# Altium footprint library AltiumDesignerLibraries.PcbLib: 313 footprints (part 2 of 20)
Each footprint in its own frame and in the unit in brackets; x right, y up, seen from the top. Pads: shape width x height; smd on the part's side, far side on the other; paste and mask are expansions set on the pad; w line width, h text height; cw(c..) or ccw(c..) is an arc to the next point about the centre after c.
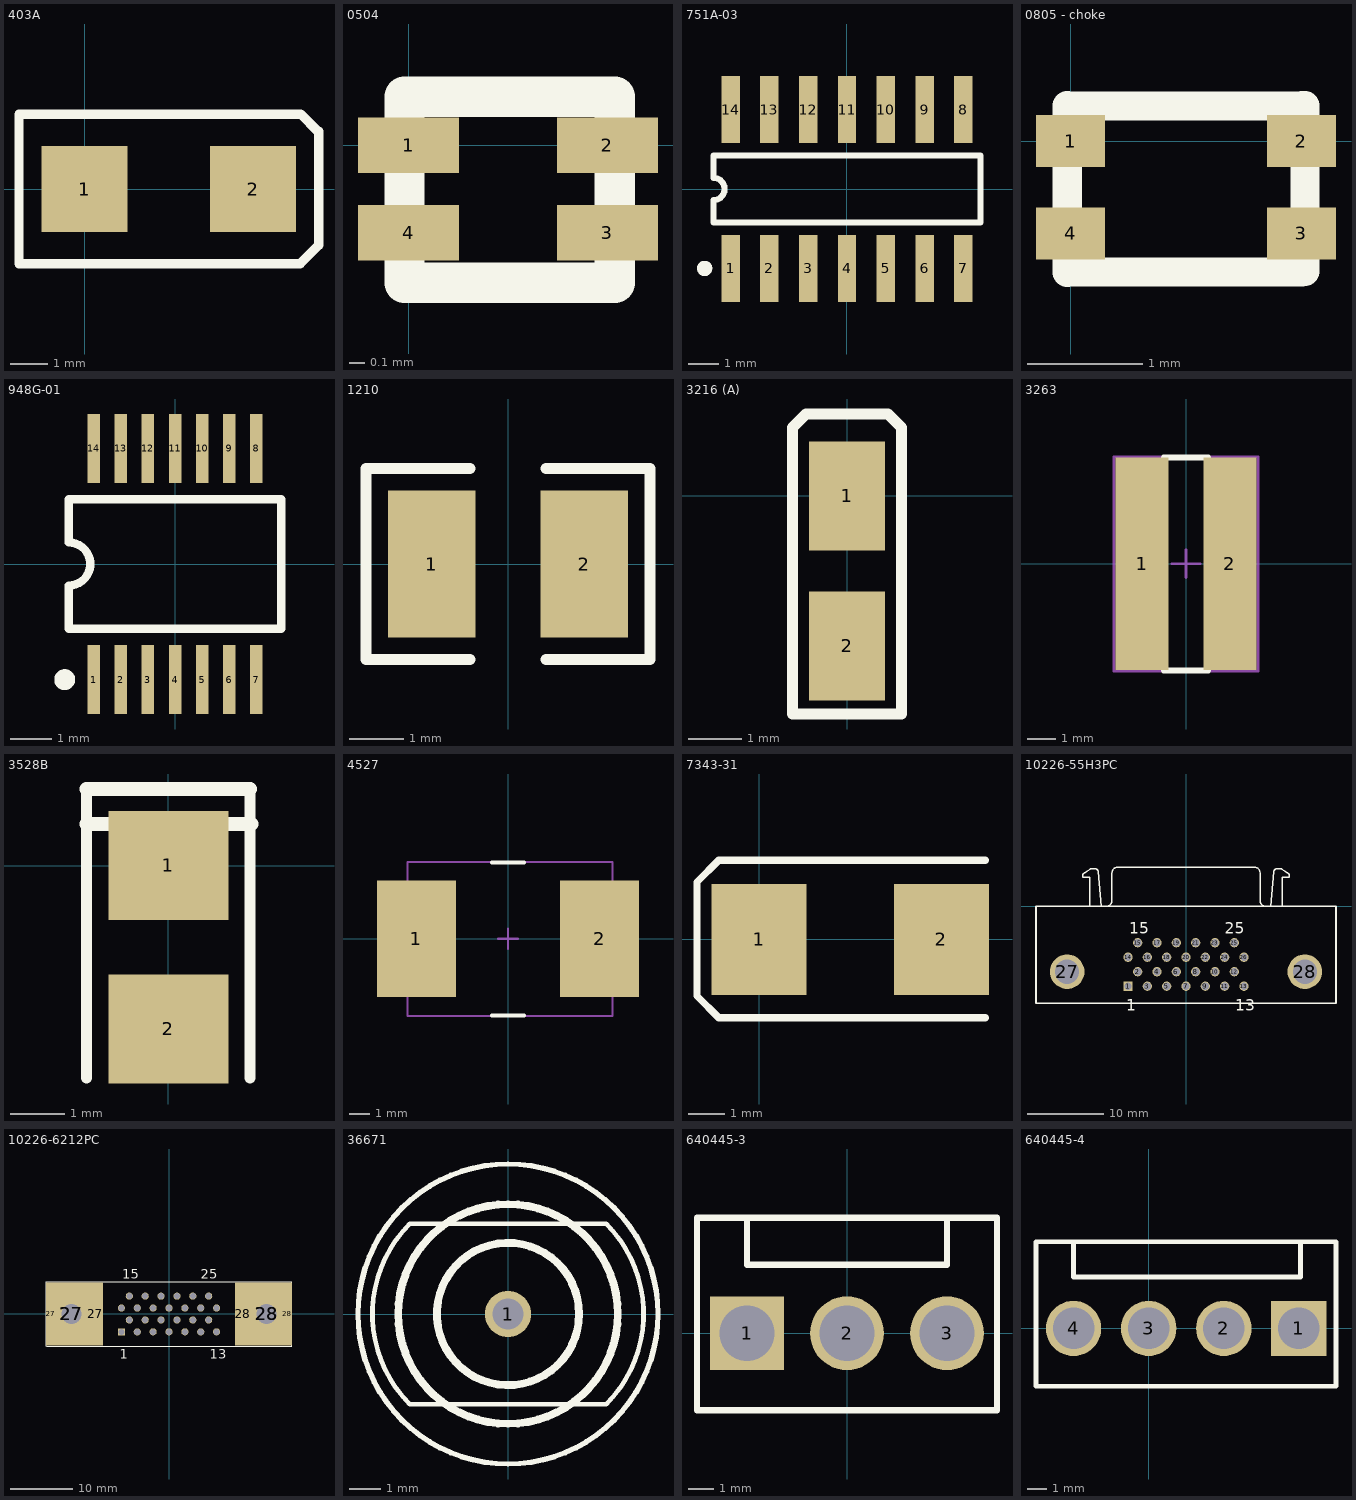
[diagram p1: the footprints below, top view; thin cyan lines are the x and y axes]

## 403A [mm] "403A Package"
pads (2):
  rect 2.3x2.3 smd: 1(0,0) 2(4.5,0)
Top Overlay:
  lines w0.25: 5.76,-2 -1.75,-2 -1.75,2 5.76,2 ; 5.76,-1.99 6.26,-1.49 ; 5.77,2 6.22,1.55 ; 6.25,-1.5 6.25,1.54

## 0504 [mm]
pads (4):
  rect 0.635x0.35 smd: 1(0,0) 2(1.25,0) 3(1.25,-0.55) 4(0,-0.55)
Top Overlay:
  lines w0.254: -0.025,-0.864 -0.025,0.305 1.295,0.305 1.295,-0.864 -0.025,-0.864

## 751A-03 [mm]
pads (14):
  rect 0.6x2.2 smd: 1(-3.81,-2.6) 2(-2.54,-2.6) 3(-1.27,-2.6) 4(0,-2.6) 5(1.27,-2.6) 6(2.54,-2.6) 7(3.81,-2.6) 8(3.81,2.6) 9(2.54,2.6) 10(1.27,2.6) 11(0,2.6) 12(-1.27,2.6) 13(-2.54,2.6) 14(-3.81,2.6)
Top Overlay:
  circle w0.25: c-4.66,-2.6 r0.125
  lines w0.2: -4.375,-1.1 -4.375,-0.367 ccw(c-4.375,0) -4.375,0.367 -4.375,1.1 4.375,1.1 4.375,-1.1 -4.375,-1.1

## 0805 - choke [mm]
pads (4):
  rect 0.6x0.45 smd: 1(0,0) 2(2,0) 3(2,-0.8) 4(0,-0.8)
Top Overlay:
  lines w0.254: -0.03,-1.134 -0.03,0.306 ; -0.028,-1.136 2.003,-1.135 ; -0.025,0.305 2.006,0.306 ; 2.031,-1.128 2.031,0.306

## 948G-01 [mm]
pads (14):
  rect 0.3x1.65 smd: 1(-1.95,-2.775) 2(-1.3,-2.775) 3(-0.65,-2.775) 4(0,-2.775) 5(0.65,-2.775) 6(1.3,-2.775) 7(1.95,-2.775) 8(1.95,2.775) 9(1.3,2.775) 10(0.65,2.775) 11(0,2.775) 12(-0.65,2.775) 13(-1.3,2.775) 14(-1.95,2.775)
Top Overlay:
  circle w0.25: c-2.65,-2.775 r0.125
  lines w0.2: -2.55,-1.55 -2.55,-0.517 ccw(c-2.55,0) -2.55,0.517 -2.55,1.55 2.55,1.55 2.55,-1.55 -2.55,-1.55

## 1210 [mm]
pads (2):
  rect 1.6x2.7 smd: 1(-1.4,0) 2(1.4,0)
Top Overlay:
  lines w0.2: -0.7,-1.75 -2.6,-1.75 -2.6,1.75 -0.7,1.75 ; 0.7,-1.75 2.6,-1.75 2.6,1.75 0.7,1.75

## 3216 (A) [mil]
pads (2):
  rect 56x80 smd: 1(0,0) 2(0,-110)
Top Overlay:
  lines w8: -40,-160 -40,50 -30,60 30,60 40,50 40,-160 -40,-160

## 3263 [mm] "1225 in  Chip Res/Cap Body"
height 0.762
pads (2):
  rect 1.9x7.6 smd: 1(-1.57,0) 2(1.57,0)
Top Overlay:
  lines w0.2: -0.8,-3.825 0.8,-3.825 ; -0.8,3.8 0.8,3.8
Mechanical 13:
  lines w0.1: -2.4,-3.85 2.4,-3.85 2.4,3.825 -2.4,3.825 -2.4,-3.85
Mechanical 15:
  lines w0.1: -0.5,0 0.5,0 ; 0,-0.5 0,0.5 ; -2.575,-3.85 2.575,-3.85 2.575,3.825 -2.575,3.825 -2.575,-3.85
3D body: height 1.4, standoff 0, extent -2.4,-3.925 2.4,3.9

## 3528B [mm] "Capacitor package"
pads (2):
  rect 2.2x2 smd: 1(-0.002,0.003) 2(-0.002,-2.997)
Top Overlay:
  lines w0.2: -1.502,-3.897 -1.502,1.403 ; 1.498,-3.897 1.498,1.403
  lines w0.254: -1.502,0.762 1.524,0.762 ; -1.502,1.403 1.498,1.403

## 4527 [mm] "4527 J Lead"
height 2.41
pads (2):
  rect 3.94x5.84 smd: 1(-4.575,0) 2(4.575,0)
Top Overlay:
  lines w0.2: -0.8,-3.825 0.8,-3.825 ; -0.8,3.8 0.8,3.8
Mechanical 13:
  lines w0.1: -0.5,0 0.5,0 ; 0,-0.5 0,0.5 ; -5.02,-3.85 5.21,-3.85 5.21,3.825 -5.02,3.825 -5.02,-3.85
3D body: height 1.4, standoff 0, extent -5.05,-3.925 5.23,3.9

## 7343-31 [mm]
pads (2):
  rect 2.6x3.048 smd: 1(0,0) 2(5,0)
Top Overlay:
  lines w0.2: -1.7,-1.525 -1.7,-1.55 ; 6.2,-2.15 -1.1,-2.15 -1.7,-1.55 ; 6.2,2.175 -1.1,2.175 -1.7,1.575 ; -1.7,-1.55 -1.7,1.575 ; -1.7,1.575 -1.7,1.575

## 10226-55H3PC [mil]
pads (28):
  rect 48x48 hole 38: 1(-300,-414)
  round 48 hole 38: 2(-250,-339) 3(-200,-414) 4(-150,-339) 5(-100,-414) 6(-50,-339) 7(0,-414) 8(50,-339) 9(100,-414) 10(150,-339) 11(200,-414) 12(250,-339) 13(300,-414) 14(-300,-264) 15(-250,-189) 16(-200,-264) 17(-150,-189) 18(-100,-264) 19(-50,-189) 20(0,-264) 21(50,-189) 22(100,-264) 23(150,-189) 24(200,-264) 25(250,-189) 26(300,-264)
  round 179.13 hole 125: 27(-614.96,-338.98) 28(614.96,-338.98)
Top Overlay:
  lines w7.87: -776.18,-502.36 -776.18,0 ; -776,-502 776,-502 ; -776,0 776,0 ; -531.69,168.11 -494.69,192.82 -466.25,192.82 cw(c-470.28,177.17) -454.11,177.17 ; -531.14,167.51 ccw(c-522.24,157.87) -532.09,149.21 -497.44,149.21 -497.44,0 ; -454.13,177.95 -439.57,0 ; -410.43,0.2 ccw(c-410.43,27.56) -383.07,27.56 -383.07,173.23 cw(c-355.71,173.23) -355.71,200.59 ; -355.71,201.18 355.71,201.18 ; 355.71,200.98 cw(c355.71,173.62) 383.07,173.62 383.07,27.56 ccw(c410.43,27.56) 410.43,0.2 ; 439.57,0 454.13,177.95 ; 454.11,177.17 cw(c470.28,177.17) 466.25,192.82 494.69,192.82 531.69,168.11 ; 497.44,0 497.44,149.21 532.09,149.21 ccw(c522.24,157.87) 531.14,167.51 ; 776.18,-502.36 776.18,0
  text "25" at 200.79,-142.52 h59.06
  text "15" at -294.29,-142.52 h59.06
  text "13" at 255.71,-540.75 h59.06
  text "1" at -309.84,-540.75 h59.06
3D body: height 370, standoff -110, extent -726.85,-447.4 733.15,212.6

## 10226-6212PC [mil]
pads (34):
  rect 45x45 hole 38: 1(-300,-112.5)
  round 45 hole 38: 2(-250,-37.5) 3(-200,-112.5) 4(-150,-37.5) 5(-100,-112.5) 6(-50,-37.5) 7(0,-112.5) 8(50,-37.5) 9(100,-112.5) 10(150,-37.5) 11(200,-112.5) 12(250,-37.5) 13(300,-112.5) 14(-300,37.5) 15(-250,112.5) 16(-200,37.5) 17(-150,112.5) 18(-100,37.5) 19(-50,112.5) 20(0,37.5) 21(50,112.5) 22(100,37.5) 23(150,112.5) 24(200,37.5) 25(250,112.5) 26(300,37.5)
  rect 60x400 smd: 27(-745,0) 28(745,0)
  rect 200x400 on Top hole 125: 27(-614.96,0) 28(614.96,0)
  round 179.13 hole 125: 27(-614.96,0)
  rect 100x400 smd: 27(-465,0) 28(465,0)
  round 179.13 hole 109.06: 28(614.96,0)
Top Overlay:
  lines w7.87: -774,-202.91 -774,203 774,203 ; -769.48,-203 774.48,-203 774.48,203
  text "1" at -309.84,-280.71 h59.06
  text "13" at 255.71,-280.71 h59.06
  text "15" at -294.29,221.65 h59.06
  text "25" at 200.79,221.65 h59.06

## 36671 [mm] "Plastics1, Front or rear loading, 1.5mm touchproof connector"
height 21.6
pads (1):
  round 1.5 hole 1: 1(0,0)
Top Overlay:
  circle w0.254: c0,0 r3.55
  circle w0.254: c0,0 r2.3
  circle w0.175: c0,0 r4.85
  lines w0.15: -3.175,-2.921 cw(c-0.254,0) -3.175,2.921 3.175,2.921 cw(c0.254,0) 3.175,-2.921 -3.175,-2.921

## 640445-3 [mil]
pads (3):
  rect 115x115 hole 86: 1(-156,0)
  round 115 hole 86: 2(0,0) 3(156,0)
Top Overlay:
  lines w10: -156,107 156,107 ; -156,108 -156,180 ; 154,107 156,109 156,180 ; -234,-120 234,-120 234,180 0,180 -234,180 -234,-120

## 640445-4 [mil]
pads (4):
  rect 115x115 hole 86: 1(312,0)
  round 115 hole 86: 2(156,0) 3(0,0) 4(-156,0)
Top Overlay:
  lines w10: -156,107 156,107 ; -156,108 -156,180 ; 154,107 315,107 ; 315,110 315,180 ; -234,-120 389,-120 389,180 0,180 -234,180 -234,-120